# Altium footprint library Component.PcbLib: 115 footprints (part 4 of 8)
Each footprint in its own frame and in the unit in brackets; x right, y up, seen from the top. Pads: shape width x height; smd on the part's side, far side on the other; paste and mask are expansions set on the pad; w line width, h text height; cw(c..) or ccw(c..) is an arc to the next point about the centre after c.
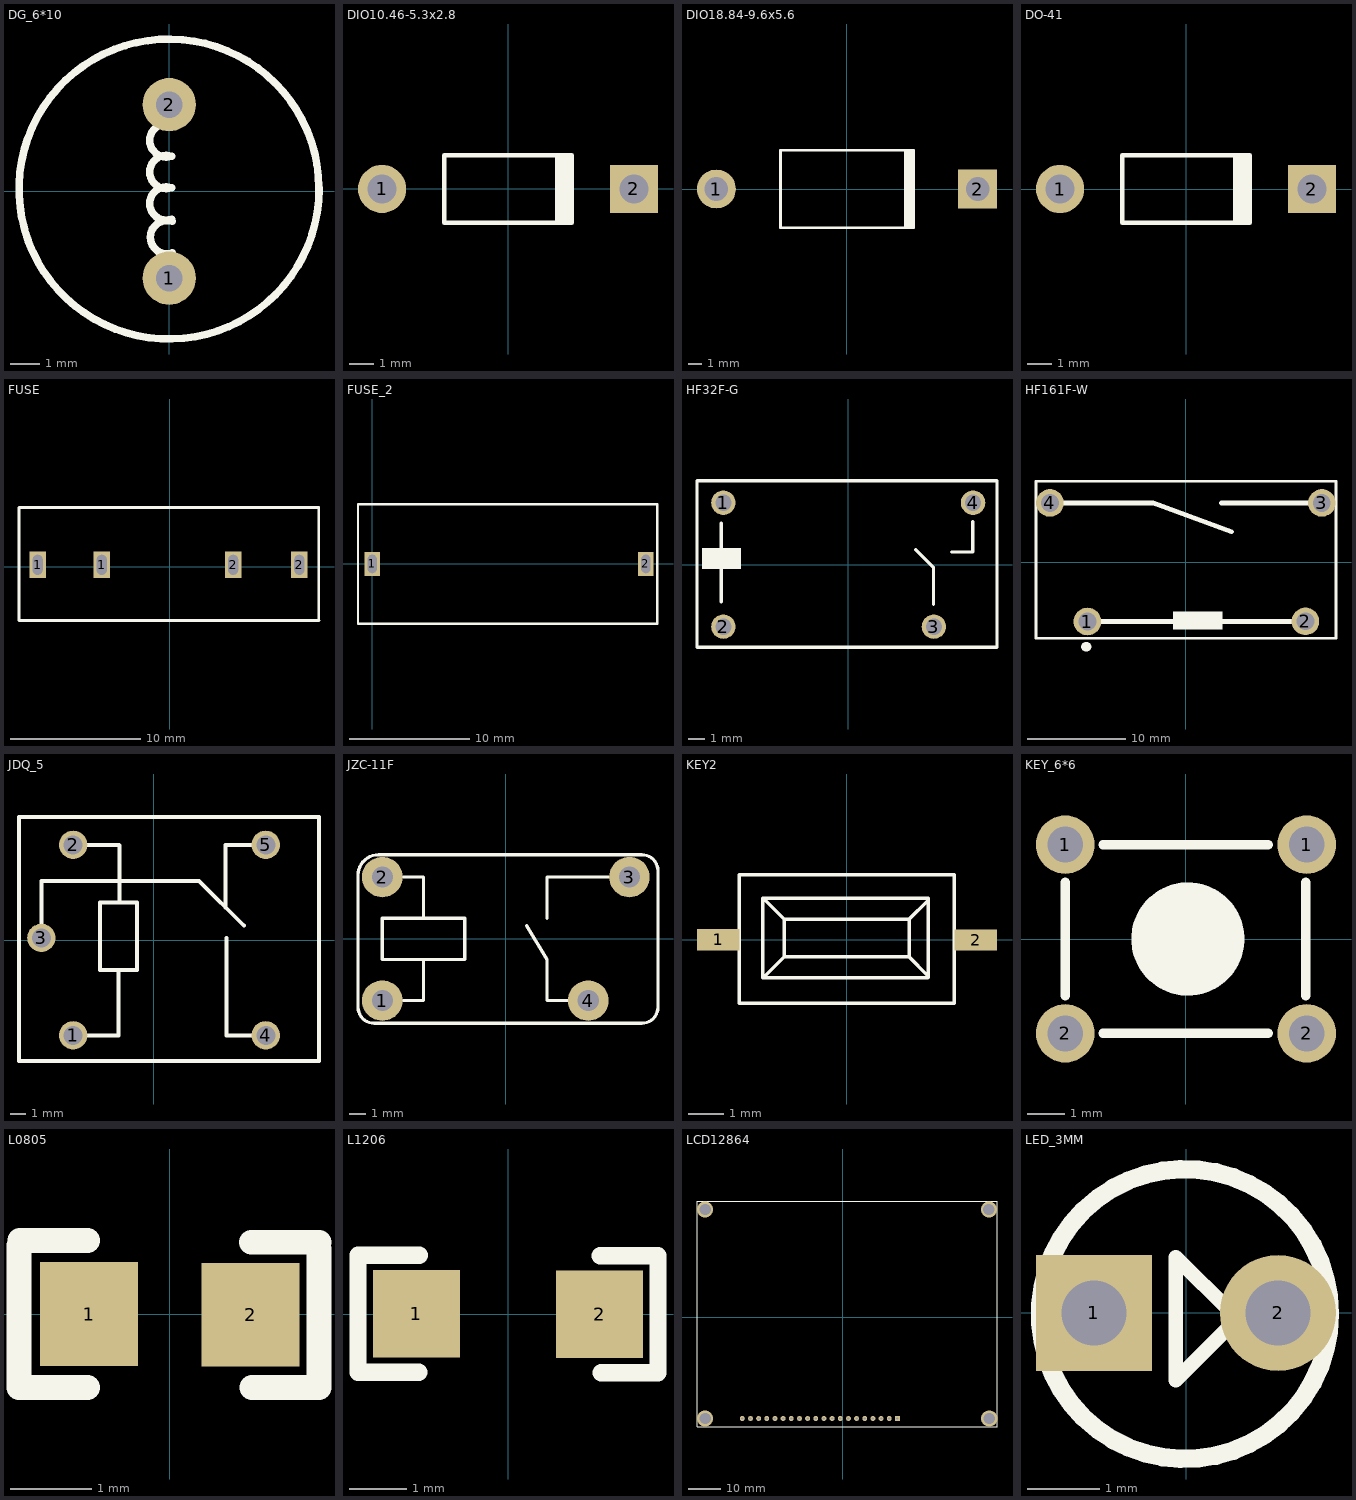
[diagram p3: the footprints below, top view; thin cyan lines are the x and y axes]

## DG_6*10 [mm]
height 1.99
pads (2):
  round 1.8 hole 0.9: 1(0,-2.933) 2(0,2.933)
Top Overlay:
  lines w0.254: 0.08,-0.945 cw(c-0.098,-0.411) 0.08,0.122 cw(c-0.098,0.656) 0.08,1.19 cw(c-0.098,1.723) 0.08,2.257 ; 0.1,-2.083 cw(c-0.078,-1.549) 0.1,-1.016 ; 5.06,0.077 cw(c-0.01,0.08) 5.06,0.127
3D body: height 5, standoff 0, extent -0.893,-3.851 0.9,-2.055
3D body: height 5, standoff 0, extent -0.893,2.081 0.9,3.877

## DIO10.46-5.3x2.8 [mm]
pads (2):
  round 2 hole 1.2: 1(-5.23,0)
  rect 2x2 hole 1.2: 2(5.23,0)
Top Overlay:
  rectangle: 1.95,-1.402 2.75,1.398
  lines w0.2: 2.65,-1.4 -2.65,-1.4 -2.65,1.4 2.65,1.4

## DIO18.84-9.6x5.6 [mm]
pads (2):
  round 2.8 hole 1.7: 1(-9.42,0)
  rect 2.8x2.8 hole 1.7: 2(9.42,0)
Top Overlay:
  rectangle: 4.1,-2.8 4.9,2.8
  lines w0.2: 4.8,-2.8 -4.8,-2.8 -4.8,2.8 4.8,2.8

## DO-41 [mm] "Diode, Axial; Body 5.2 x 2.7 mm (LxDia. max), Lead Dia. 0.86 mm (max)"
height 2.8
pads (2):
  round 2 hole 1.2: 1(-5.23,0)
  rect 2x2 hole 1.2: 2(5.23,0)
Top Overlay:
  rectangle: 1.95,-1.4 2.75,1.4
  lines w0.2: 2.65,-1.4 -2.65,-1.4 -2.65,1.4 2.65,1.4

## FUSE [mm] "5X20"
pads (4):
  rect 1.27x2.032 hole 0.762 slot 1.524 at 90 deg: 1(-10.15,0.15) 1(-5.23,0.15) 2(4.86,0.15) 2(9.94,0.15)
Top Overlay:
  lines w0.2: -11.58,-4.12 -11.58,4.55 11.42,4.55 11.42,-4.09 11.45,-4.12 -11.58,-4.12
3D body: height 9.99, standoff -3.5, extent -10.58,-3.31 10.22,3.69

## FUSE_2 [mil] "body:25x10mm,pin 23mm"
pads (2):
  rect 50x80 hole 30 slot 60 at 90 deg: 1(0,0) 2(899.61,0)
Top Overlay:
  lines w7.87: -46.85,-196.46 937.01,-196.46 937.01,196.06 -46.85,196.06 -46.85,-196.46
3D body: height 393.29, standoff -137.8, extent 41.34,-150.79 860.24,124.8

## HF32F-G [mm]
pads (4):
  round 1.5 hole 1: 1(-7.655,3.8) 2(-7.655,-3.8) 3(5.255,-3.8) 4(7.655,3.8)
Top Overlay:
  rectangle: -8.965,-0.28 -6.585,1.01
  lines w0.2: -7.795,-2.27 -7.795,2.54 ; 4.145,0.92 5.225,-0.16 5.225,-2.44 ; 6.355,0.77 7.635,0.77 7.635,2.65 ; -9.275,-5.06 9.125,-5.06 9.125,5.14 -9.275,5.14 -9.275,-5.06

## HF161F-W [mm]
pads (4):
  round 2.8 hole 1.8: 1(-9.975,-6.01) 2(12.115,-5.99) 3(13.775,6.01) 4(-13.775,6.01)
Top Overlay:
  rectangle: -1.325,-6.8 3.715,-4.98
  lines w0.254: -15.185,-7.69 -15.185,8.21 15.215,8.21 15.215,-7.69 -15.185,-7.69
  lines w0.5: -13.775,6.01 -3.355,6.01 4.615,3.09 ; -9.975,-6.01 12.095,-6.01 ; 3.615,6.01 13.775,6.01
  lines w1: -10.115,-8.57 -10.045,-8.57
3D body: height 24.3, standoff 1, extent -15.255,-7.76 15.225,8.19

## JDQ_5 [mm]
pads (5):
  round 1.8 hole 1.2: 1(-5.1,-6.035) 2(-5.1,6.035) 3(-7.11,0.139) 4(7.11,-6.035) 5(7.11,6.035)
Top Overlay:
  lines w0.254: -8.53,-7.665 10.48,-7.665 10.48,7.805 -8.53,7.805 -8.53,-7.595 ; -7.11,0.139 -7.11,2.283 -7.11,3.755 2.87,3.755 5.715,0.91 ; -5.1,-6.035 -2.21,-6.035 -2.21,-1.945 ; -5.1,6.035 -2.2,6.035 -2.17,6.005 -2.17,2.525 ; 4.54,2.075 4.54,6.035 7.11,6.035 ; 4.61,0.125 4.61,-6.035 7.11,-6.035 ; -3.41,-1.895 -1.04,-1.895 -1.04,2.375 -3.41,2.375 -3.41,-1.895

## JZC-11F [mm]
height 1.99
pads (4):
  round 2.5 hole 1.3: 1(-7.62,-3.81) 2(-7.62,3.81) 3(7.62,3.81) 4(5.08,-3.81)
Top Overlay:
  lines w0.2: -6.35,-3.81 -5.08,-3.81 -5.08,-1.27 ; -6.35,3.81 -5.08,3.81 -5.08,1.27 ; 1.28,0.81 2.54,-1.27 2.54,-3.81 3.81,-3.81 ; 2.54,1.27 2.54,3.81 6.35,3.81 ; -5.08,1.27 -7.62,1.27 -7.62,-1.27 -2.54,-1.27 -2.54,1.27 -5.08,1.27 ; -9.12,-4.21 ccw(c-8.12,-4.21) -8.12,-5.21 8.38,-5.21 ccw(c8.38,-4.21) 9.38,-4.21 9.38,4.19 ccw(c8.38,4.19) 8.38,5.19 -7.62,5.19 -7.85,5.19 ccw(c-7.85,3.92) -9.12,3.92 -9.12,-4.21
3D body: height 14, standoff 0, extent -9.12,-5.21 9.38,5.19

## KEY2 [mm] "body:3.6x8mm,2PIN,8.2MM"
pads (2):
  rect 1.2x0.6 smd: 1(-3.63,0.005) 2(3.63,-0.005)
Top Overlay:
  lines w0.1: 1.72,-0.48 -1.77,-0.48 ; -2.37,-1.07 -2.37,1.17 ; -2.37,-1.07 2.28,-1.07 ; -2.37,-1.07 -2.36,-1.07 -1.77,-0.48 ; -2.37,1.17 2.29,1.17 ; -2.37,1.17 -2.36,1.17 -1.77,0.58 ; -1.77,-0.48 -1.77,0.58 ; -1.77,-0.48 1.75,-0.48 ; -1.77,0.58 1.75,0.58 ; 1.75,-0.48 1.75,0.58 ; 1.75,-0.48 2.28,-1.01 2.28,-1.07 ; 1.75,0.58 2.29,1.12 2.29,1.17 ; 2.28,-1.07 2.29,-1.06 2.29,1.17 ; -3.04,-1.785 -3.04,1.835 3.02,1.835 3.02,-1.785 -3.04,-1.785

## KEY_6*6 [mil]
pads (4):
  round 62 hole 38: 1(-127.95,100) 1(127.95,100) 2(-127.95,-100) 2(127.95,-100)
Top Overlay:
  circle w60: c2.05,0 r30
  lines w10: -127.98,-60 -127.98,60 ; -87.98,-100 87.05,-100 ; -87.98,100 87.05,100 ; 127.05,-60 127.05,60
3D body: height 196.85, standoff -78.74, extent -131.69,-123.22 126.18,120.87

## L0805 [mm]
pads (2):
  rect 1.2x1.27 smd: 1(-0.99,0.005) 2(0.99,-0.005)
Top Overlay:
  lines w0.305: -1.85,-0.895 -1.85,0.845 ; -1.84,0.905 -1.01,0.905 ; -1.82,-0.895 -1.01,-0.895 ; 1,0.885 1.83,0.885 ; 1.01,-0.895 1.83,-0.895 1.83,0.805
3D body: height 0.78, standoff 0, extent -1,-0.63 1,0.62

## L1206 [mm]
height 1.99
pads (2):
  rect 1.524x1.524 smd: 1(-1.6,0.005) 2(1.6,-0.005)
Top Overlay:
  lines w0.305: -1.56,-1.015 -2.62,-1.015 -2.62,1.025 ; 1.61,1.015 2.62,1.015 2.62,-1.025 1.63,-1.025 ; -2.62,1.025 -1.55,1.025 -2.62,1.025
3D body: height 1, standoff 0, extent -1.58,-0.8 1.62,0.8

## LCD12864 [mil]
pads (20):
  rect 60x60 hole 30: 1(672.44,-1238.19)
  round 60 hole 30: 2(572.44,-1238.19) 3(472.44,-1238.19) 4(372.44,-1238.19) 5(272.44,-1238.19) 6(172.44,-1238.19) 7(72.44,-1238.19) 8(-27.56,-1238.19) 9(-127.56,-1238.19) 10(-227.56,-1238.19) 11(-327.56,-1238.19) 12(-427.56,-1238.19) 13(-527.56,-1238.19) 14(-627.56,-1238.19) 15(-727.56,-1238.19) 16(-827.56,-1238.19) 17(-927.56,-1238.19) 18(-1027.56,-1238.19) 19(-1127.56,-1238.19) 20(-1227.56,-1238.19)
via -1682.56,-1238.19 diameter 196.85 hole 137.8
via 1797.44,-1238.19 diameter 196.85 hole 137.8
via 1792.44,1321.81 diameter 196.85 hole 137.8
via -1682.56,1321.81 diameter 196.85 hole 137.8
Top Overlay:
  lines w10: -1782.56,-1338.19 1892.44,-1338.19 1892.44,1421.81 -1782.56,1421.81 -1782.56,-1338.19
3D body: height 862.6, standoff -124.02, extent -1771.65,-1334.25 1889.77,1421.66

## LED_3MM [mm]
height 1.99
pads (2):
  rect 1.6x1.6 hole 0.9: 1(-1.27,0)
  round 1.6 hole 0.9: 2(1.27,0)
Top Overlay:
  circle w0.254: c-0.015,-0.015 r2
  lines w0.2: -0.14,-0.93 0.79,0 0.63,0 -0.14,0.77 -0.14,-0.93
3D body: height 5.2, standoff -3, extent -1.96,-1.993 1.524,1.993